# Altium footprint library UserLibrary.PcbLib: 41 footprints (part 2 of 3)
Each footprint in its own frame and in the unit in brackets; x right, y up, seen from the top. Pads: shape width x height; smd on the part's side, far side on the other; paste and mask are expansions set on the pad; w line width, h text height; cw(c..) or ccw(c..) is an arc to the next point about the centre after c.
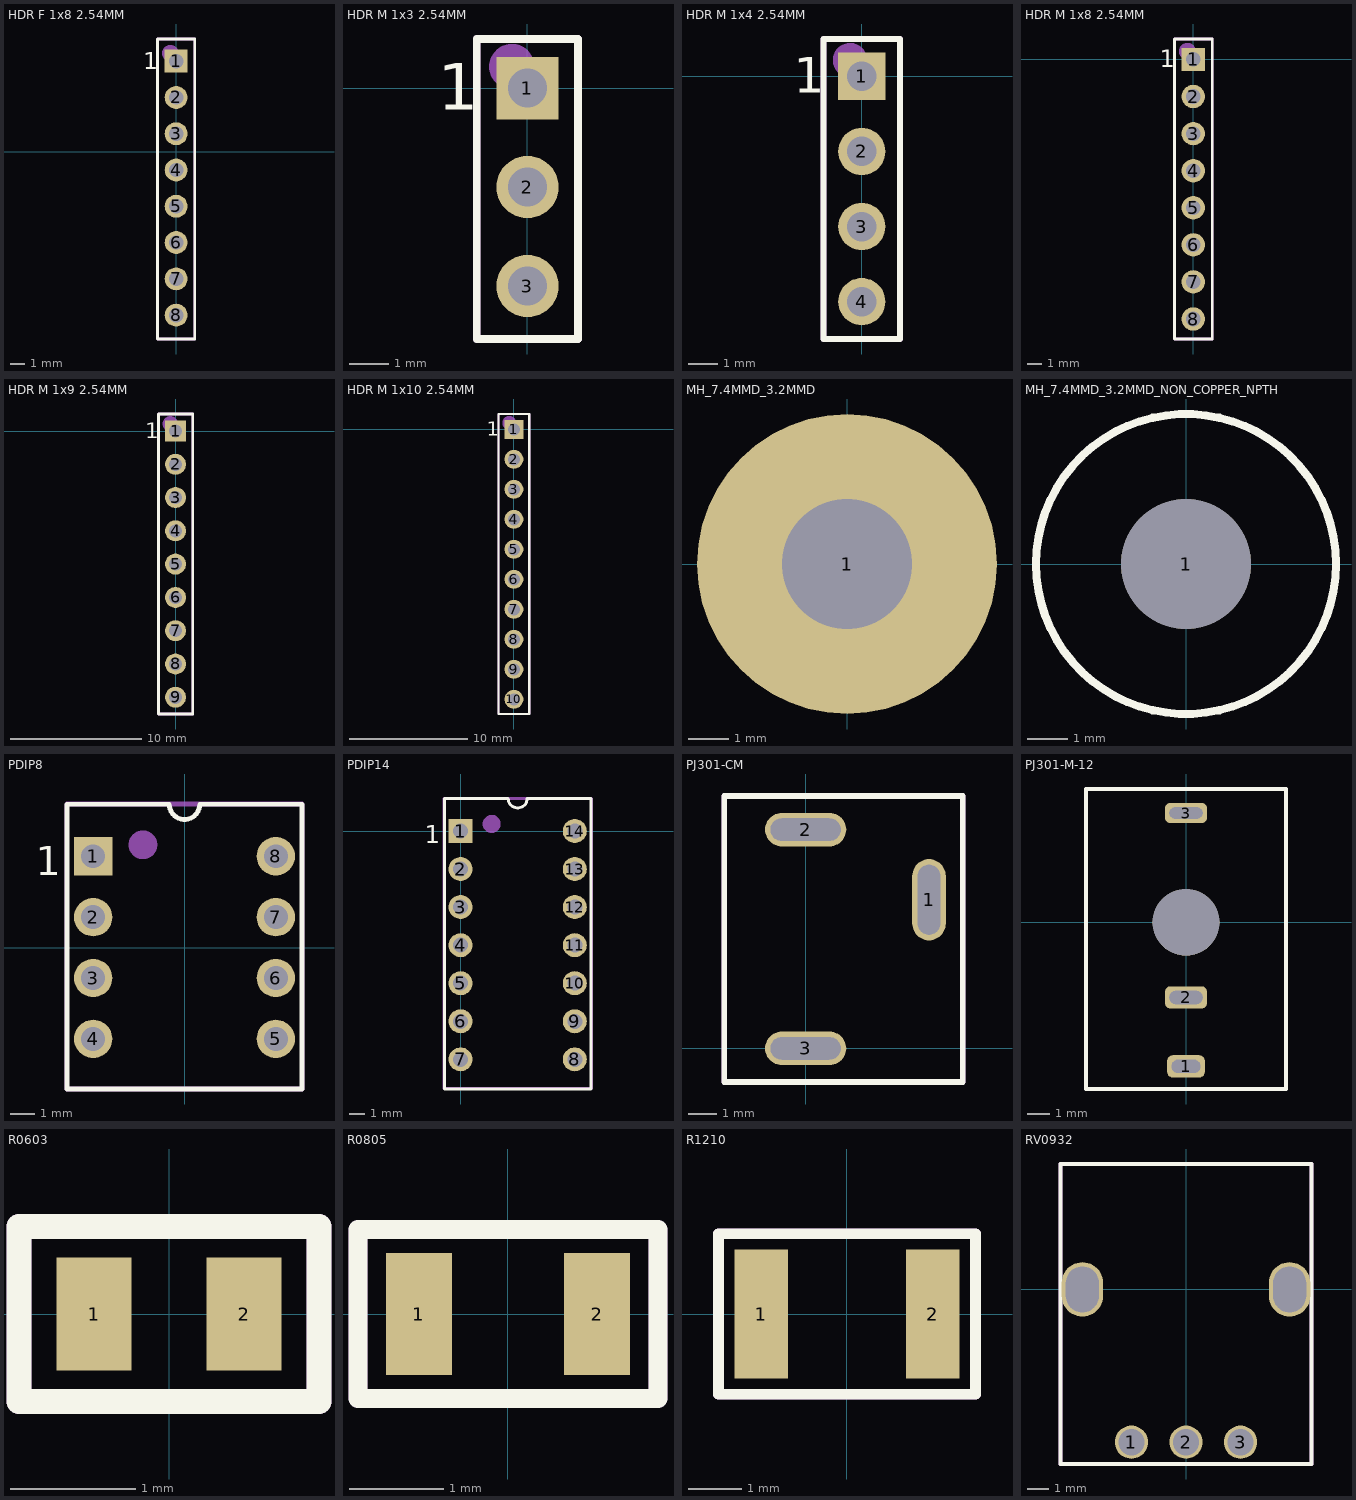
[diagram p1: the footprints below, top view; thin cyan lines are the x and y axes]

## HDR F 1x8 2.54MM [mm]
pads (8):
  rect 1.6x1.6 hole 1: 1(0,6.35)
  round 1.6 hole 1: 2(0,3.81) 3(0,1.27) 4(0,-1.27) 5(0,-3.81) 6(0,-6.35) 7(0,-8.89) 8(0,-11.43)
Top Overlay:
  lines w0.2: -1.3,-13.1 1.3,-13.1 1.3,7.9 -1.3,7.9 -1.3,-13.1
  text "1" at -2.3,5.8 h1.2
Mechanical 29:
  circle w0.6: c-0.4,6.9 r0.283
  lines w0.2: -1.3,-13.1 -1.3,7.9 1.3,7.9 1.3,-13.1 -1.3,-13.1
  text ".Designator" at 0.6,-3.7 h1.2
3D body "HEADER_6PINS_FEM.STEP": height 8.51, standoff -2.99, extent -1.27,-12.97 1.27,2.77
3D body "HEADER_6PINS_FEM.STEP": height 8.51, standoff -2.99, extent -1.27,-7.87 1.27,7.87

## HDR M 1x3 2.54MM [mm]
pads (3):
  rect 1.6x1.6 hole 1: 1(0,0)
  round 1.6 hole 1: 2(0,-2.54) 3(0,-5.08)
Top Overlay:
  lines w0.2: -1.3,-6.44 -1.3,1.26 1.3,1.26 1.3,-6.44 -1.3,-6.44
  text "1" at -2.3,-0.55 h1.2
Mechanical 1:
  text ".Designator" at 0.4,-4 h1.2
Mechanical 29:
  circle w0.6: c-0.4,0.55 r0.283
  lines w0.2: -1.3,-6.44 1.3,-6.44 1.3,1.26 -1.3,1.26 -1.3,-6.44
3D body "HEADER_3PINS_2.54MM.STEP": height 9.21, standoff -3.49, extent -1.27,-6.35 1.27,1.27

## HDR M 1x4 2.54MM [mm]
pads (4):
  rect 1.6x1.6 hole 1: 1(0,0)
  round 1.6 hole 1: 2(0,-2.54) 3(0,-5.08) 4(0,-7.62)
Top Overlay:
  lines w0.2: -1.3,-8.885 1.3,-8.885 1.3,1.265 -1.3,1.265 -1.3,-8.885
  text "1" at -2.3,-0.55 h1.2
Mechanical 29:
  circle w0.6: c-0.4,0.55 r0.283
  lines w0.2: -1.3,-8.885 -1.3,1.26 1.3,1.26 1.3,-8.885 -1.3,-8.885
  text ".Designator" at 0.4,-4 h1.2
3D body "HEADER_4PINS_2.54MM.STEP": height 9.21, standoff -3.49, extent -1.27,-8.89 1.27,1.27

## HDR M 1x8 2.54MM [mm]
pads (8):
  rect 1.6x1.6 hole 1: 1(0,0)
  round 1.6 hole 1: 2(0,-2.54) 3(0,-5.08) 4(0,-7.62) 5(0,-10.16) 6(0,-12.7) 7(0,-15.24) 8(0,-17.78)
Top Overlay:
  lines w0.2: -1.3,-19.15 1.3,-19.15 1.3,1.4 -1.3,1.4 -1.3,-19.15
  text "1" at -2.3,-0.55 h1.2
Mechanical 29:
  circle w0.6: c-0.4,0.55 r0.283
  lines w0.2: -1.3,-19.15 -1.3,1.4 1.3,1.4 1.3,-19.15 -1.3,-19.15
  text ".Designator" at 0.6,-10.05 h1.2
3D body "HEADER_4PINS_2.54MM.STEP": height 9.21, standoff -3.49, extent -1.27,-8.89 1.27,1.27
3D body "HEADER_4PINS_2.54MM.STEP": height 9.21, standoff -3.49, extent -1.27,-19.05 1.27,-8.89

## HDR M 1x9 2.54MM [mm]
pads (9):
  rect 1.6x1.6 hole 1: 1(0,0)
  round 1.6 hole 1: 2(0,-2.54) 3(0,-5.08) 4(0,-7.62) 5(0,-10.16) 6(0,-12.7) 7(0,-15.24) 8(0,-17.78) 9(0,-20.32)
Top Overlay:
  lines w0.2: -1.3,-21.6 1.3,-21.6 1.3,1.3 -1.3,1.3 -1.3,-21.6
  text "1" at -2.3,-0.55 h1.2
Mechanical 29:
  circle w0.6: c-0.4,0.55 r0.283
  lines w0.2: -1.3,-21.6 -1.3,1.3 1.3,1.3 1.3,-21.6 -1.3,-21.6
  text ".Designator" at 0.6,-10.05 h1.2
3D body "HEADER_4PINS_2.54MM.STEP": height 9.21, standoff -3.49, extent -1.27,-8.89 1.27,1.27
3D body "HEADER_4PINS_2.54MM.STEP": height 9.21, standoff -3.49, extent -1.27,-19.05 1.27,-8.89
3D body "HEADER_4PINS_2.54MM.STEP": height 9.21, standoff -3.49, extent -1.27,-21.59 1.27,-11.43

## HDR M 1x10 2.54MM [mm]
pads (10):
  rect 1.6x1.6 hole 1: 1(0,0)
  round 1.6 hole 1: 2(0,-2.54) 3(0,-5.08) 4(0,-7.62) 5(0,-10.16) 6(0,-12.7) 7(0,-15.24) 8(0,-17.78) 9(0,-20.32) 10(0,-22.86)
Top Overlay:
  lines w0.2: -1.3,-24.1 1.3,-24.1 1.3,1.3 -1.3,1.3 -1.3,-24.1
  text "1" at -2.3,-0.55 h1.2
Mechanical 29:
  circle w0.6: c-0.4,0.55 r0.283
  lines w0.2: -1.3,-24.1 -1.3,1.3 1.3,1.3 1.3,-24.1 -1.3,-24.1
  text ".Designator" at 0.6,-10.05 h1.2
3D body "HEADER_4PINS_2.54MM.STEP": height 9.21, standoff -3.49, extent -1.27,-8.89 1.27,1.27
3D body "HEADER_4PINS_2.54MM.STEP": height 9.21, standoff -3.49, extent -1.27,-19.05 1.27,-8.89
3D body "HEADER_4PINS_2.54MM.STEP": height 9.21, standoff -3.49, extent -1.27,-24.1 1.27,-13.94

## MH_7.4MMD_3.2MMD [mm]
pads (1):
  round 7.4 hole 3.2: 1(0,0)

## MH_7.4MMD_3.2MMD_NON_COPPER_NPTH [mm]
pads (1):
  round 3.2 hole 3.2 unplated: 1(0,0)
Top Overlay:
  circle w0.2: c0,0 r3.7

## PDIP8 [mm]
pads (8):
  rect 1.6x1.6 hole 1: 1(-3.81,3.81)
  round 1.6 hole 1: 2(-3.81,1.27) 3(-3.81,-1.27) 4(-3.81,-3.81) 5(3.81,-3.81) 6(3.81,-1.27) 7(3.81,1.27) 8(3.81,3.81)
Top Overlay:
  lines w0.2: -4.9,-5.9 -4.9,5.98 -0.635,5.98 ccw(c0,5.98) 0.635,5.98 4.9,5.98 4.9,-5.9 -4.9,-5.9
  text "1" at -6.21,3.01 h1.2
Mechanical 29:
  circle w0.6: c-1.735,4.285 r0.3
  lines w0.2: -4.91,-5.9 -4.91,5.985 4.915,5.985 4.915,-5.9 -4.91,-5.9
  text ".Designator" at -1.275,-1.575 h1.2
3D body "DIP8.STEP": height 4.19, standoff -2.67, extent -3.9,-5.715 3.974,5.715

## PDIP14 [mm]
pads (14):
  rect 1.6x1.6 hole 1: 1(0,0)
  round 1.6 hole 1: 2(0,-2.54) 3(0,-5.08) 4(0,-7.62) 5(0,-10.16) 6(0,-12.7) 7(0,-15.24) 8(7.62,-15.24) 9(7.62,-12.7) 10(7.62,-10.16) 11(7.62,-7.62) 12(7.62,-5.08) 13(7.62,-2.54) 14(7.62,0)
Top Overlay:
  lines w0.2: -1.09,-17.22 8.71,-17.22 8.71,2.17 4.445,2.17 cw(c3.81,2.17) 3.175,2.17 -1.09,2.17 -1.09,-17.22
  text "1" at -2.4,-0.8 h1.2
Mechanical 29:
  circle w0.6: c2.075,0.475 r0.3
  lines w0.2: -1.1,-17.2 8.725,-17.2 8.725,2.175 -1.1,2.175 -1.1,-17.2
  text ".Designator" at 3,-7.9 h1.2
3D body "DIP14.STEP": height 4.19, standoff -2.67, extent -0.064,-17.145 7.81,1.905

## PJ301-CM [mm]
pads (3):
  oval 1.2x2.9 hole 0.8 slot 2.5 at 90 deg: 1(4.4,5.3)
  oval 2.9x1.2 hole 0.8 slot 2.5 at 0 deg: 2(0,7.8) 3(0,0)
Top Overlay:
  lines w0.2: -2.9,-1.2 5.6,-1.2 5.6,9 -2.9,9 -2.9,-1.2
Mechanical 29:
  lines w0.2: -2.9,-1.2 5.6,-1.2 5.6,9 -2.9,9 -2.9,-1.2
  text ".Designator" at -0.2,3.2 h1.2
3D body "PJ301C.stp": height 14.11, standoff -3.19, extent -2.9,-1.2 5.6,9

## PJ301-M-12 [mm]
pads (4):
  rrect50% 1.7x1 hole 0.6 slot 1.3 at 0 deg: 1(0,-6.48)
  rrect50% 1.9x1 hole 0.6 slot 1.5 at 0 deg: 2(0,-3.38)
  rrect50% 1.9x0.9 hole 0.5 slot 1.5 at 0 deg: 3(0,4.92)
  round 3 hole 3 unplated: ""(0,0)
Top Overlay:
  lines w0.2: -4.5,-7.5 -4.5,6 4.5,6 4.5,-7.5 -4.5,-7.5
3D body "PJ301M-12.STEP": height 14.5, standoff -3.52, extent -4.5,-6.68 4.5,5.95

## R0603 [mm]
pads (2):
  rect 0.6x0.9 smd: 1(-0.6,0) 2(0.6,0)
Top Overlay:
  lines w0.2: -1.2,-0.7 1.2,-0.7 1.2,0.7 -1.2,0.7 -1.2,-0.7
Mechanical 29:
  lines w0.2: -1.2,-0.7 -1.2,0.7 1.2,0.7 1.2,-0.7 -1.2,-0.7
  text ".Designator" at -0.7,-0.2 h0.6
3D body "RESC1508X63N EIA 0603.step": height 0.64, standoff 0.01, extent -0.75,-0.4 0.75,0.4

## R0805 [mm]
pads (2):
  rect 0.7x1.3 smd: 1(-0.95,0) 2(0.95,0)
Top Overlay:
  lines w0.2: -1.6,-0.9 1.6,-0.9 1.6,0.9 -1.6,0.9 -1.6,-0.9
Mechanical 29:
  lines w0.2: -1.6,-0.9 1.6,-0.9 1.6,0.9 -1.6,0.9 -1.6,-0.9
  text ".Designator" at -1.1,-0.3 h0.6
3D body "RESC2012X60N EIA 0805.step": height 0.61, standoff 0.01, extent -1,-0.6 1,0.6

## R1210 [mm]
pads (2):
  rect 1x2.4 smd: 1(-1.6,0) 2(1.6,0)
Top Overlay:
  lines w0.2: -2.4,-1.5 2.4,-1.5 2.4,1.5 -2.4,1.5 -2.4,-1.5
Mechanical 29:
  lines w0.2: -2.4,-1.5 2.4,-1.5 2.4,1.5 -2.4,1.5 -2.4,-1.5
  text ".Designator" at -1.2,-0.5 h0.6
3D body "RESC3226X70N EIA 1210.step": height 0.71, standoff 0.01, extent -1.6,-1.3 1.6,1.3

## RV0932 [mm]
pads (5):
  round 1.524 hole 1.2: 1(-2.5,-7) 2(0,-7) 3(2.5,-7)
  oval 1.9x2.5 hole 2.1 slot 1.5 at 0 deg: ""(-4.75,0) ""(4.75,0)
Top Overlay:
  lines w0.2: -5.75,-8 5.75,-8 5.75,5.75 -5.75,5.75 -5.75,-8
Mechanical 29:
  lines w0.2: -5.75,-8 5.75,-8 5.75,5.75 -5.75,5.75 -5.75,-8
  text ".Designator" at -2.05,-2.9 h1.2
3D body "Potentiometer knob_A15x17-PK-AB-K-I.stp": height 27.4, standoff 10.8, extent -7.297,-7.297 7.297,7.297
3D body "Alps Alpine RK09K11310KB Pot v2.STEP": height 25, standoff -3.98, extent -5.605,-7.25 5.605,5.55